# Altium footprint library Integrated Circuits.PcbLib: 40 footprints (part 3 of 3)
Each footprint in its own frame and in the unit in brackets; x right, y up, seen from the top. Pads: shape width x height; smd on the part's side, far side on the other; paste and mask are expansions set on the pad; w line width, h text height; cw(c..) or ccw(c..) is an arc to the next point about the centre after c.
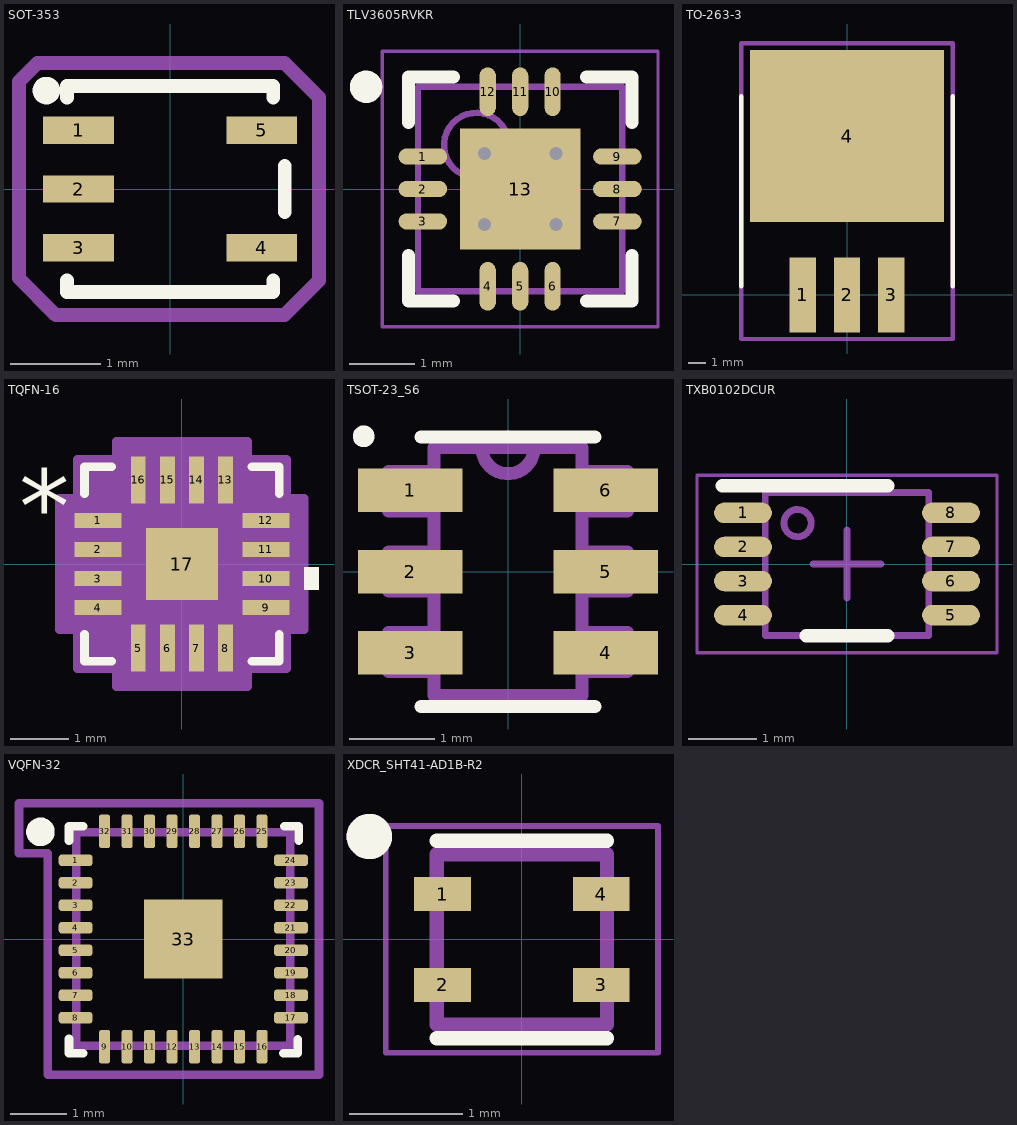
[diagram p2: the footprints below, top view; thin cyan lines are the x and y axes]

## SOT-353 [mil]
pads (5):
  rect 31x12 smd paste+0: 1(-40,25.59) 2(-40,0) 3(-40,-25.59) 4(40,-25.59) 5(40,25.59)
Top Overlay:
  circle w10: c-54,43 r1
  lines w6: -45,-40 -45,-45 45,-45 45,-40 ; -45,40 -45,45 45,45 45,40 ; 50,-10 50,10
Boundary:
  lines w6: -66,-39 -50,-55 45,-55 50,-55 65,-40 65,40 50,55 45,55 -58,55 -66,47 -66,-39
3D body "SC70-5_2P2X1P3_ONS.step": height 43.11, standoff 0, extent -41.5,-39.49 41.5,39.49

## TLV3605RVKR [mm] "QFN, 12-Leads, Body 3.00x3.00mm, Pitch 0.50mm, Thermal Pad 1.86x1.86mm, IPC Medium Density"
height 0.8
pads (13):
  oval 0.75x0.25 smd: 1(-1.5,0.5) 2(-1.5,0) 3(-1.5,-0.5) 7(1.5,-0.5) 8(1.5,0) 9(1.5,0.5)
  oval 0.25x0.75 smd: 4(-0.5,-1.5) 5(0,-1.5) 6(0.5,-1.5) 10(0.5,1.5) 11(0,1.5) 12(-0.5,1.5)
  rect 1.86x1.86 smd: 13(0,0)
via 0.55,-0.55 diameter 0.5 hole 0.2
via -0.55,-0.55 diameter 0.5 hole 0.2
via 0.55,0.55 diameter 0.5 hole 0.2
via -0.55,0.55 diameter 0.5 hole 0.2
Top Overlay:
  circle w0.25: c-2.375,1.575 r0.125
  lines w0.2: -1.725,-1.025 -1.725,-1.725 -1.025,-1.725 ; -1.725,1.025 -1.725,1.725 -1.025,1.725 ; 1.025,-1.725 1.725,-1.725 1.725,-1.025 ; 1.025,1.725 1.725,1.725 1.725,1.025
Mechanical 13:
  circle w0.1: c-0.675,0.675 r0.5
  lines w0.1: -1.575,-1.575 1.575,-1.575 1.575,1.575 -1.575,1.575 -1.575,-1.575
Mechanical 15:
  lines w0.05: -2.125,-2.125 2.125,-2.125 2.125,2.125 -2.125,2.125 -2.125,-2.125
  lines w0.1: -0.5,0 0.5,0 ; 0,-0.5 0,0.5
3D body: height 0.8, standoff 0.05, extent -1.575,-1.575 1.575,1.575

## TO-263-3 [mil]
pads (4):
  rect 60x170 smd: 1(-100,0) 2(0,0) 3(100,0)
  rect 440x390 smd: 4(0,360)
Top Overlay:
  lines w10: -240,20 -240,450 ; 240,20 240,450
Boundary:
  lines w10: -240,-100 240,-100 240,570 -240,570 -240,-100
3D body "User Library-TO263-3.STEP": height 189.26, standoff 0.29, extent -196.85,-71.46 196.85,545.47

## TQFN-16 [mil] "L"
pads (17):
  rect 32x10 smd paste+0 mask+0: 1(-57,29.53) 2(-57,9.84) 3(-57,-9.84) 4(-57,-29.53) 9(57,-29.53) 10(57,-9.84) 11(57,9.84) 12(57,29.53)
  rect 10x32 smd paste+0 mask+0: 5(-29.53,-57) 6(-9.84,-57) 7(9.84,-57) 8(29.53,-57) 13(29.53,57) 14(9.84,57) 15(-9.84,57) 16(-29.53,57)
  rect 49x49 smd paste+0 mask+0: 17(0,0)
Top Overlay:
  region: 83,-2.34 93,-2.34 93,-17.34 83,-17.34
  lines w6: -66,-47.63 -66,-66 -47.63,-66 ; -66,47.63 -66,66 -47.63,66 ; 47.63,-66 66,-66 66,-47.63 ; 47.63,66 66,66 66,47.63
  text "*" at -110.5,14.37 h50
Mechanical 13:
  lines w1: -61,11 -11,61 ; -61,-61 61,-61 61,61 -61,61 -61,-61 ; -61,-35.53 -61,-23.53 -61,-35.53 ; -61,-15.84 -61,-3.84 -61,-15.84 ; -61,3.84 -61,15.84 -61,3.84 ; -61,23.53 -61,35.53 -61,23.53 ; -35.53,-61 -23.53,-61 -35.53,-61 ; -35.53,61 -23.53,61 -35.53,61 ; -15.84,-61 -3.84,-61 -15.84,-61 ; -15.84,61 -3.84,61 -15.84,61 ; 3.84,-61 15.84,-61 3.84,-61 ; 3.84,61 15.84,61 3.84,61 ; 23.53,-61 35.53,-61 23.53,-61 ; 23.53,61 35.53,61 23.53,61 ; 61,-35.53 61,-23.53 61,-35.53 ; 61,-15.84 61,-3.84 61,-15.84 ; 61,3.84 61,15.84 61,3.84 ; 61,23.53 61,35.53 61,23.53
  text "*" at -53.5,14.37 h50
Mechanical 15:
  region: -44.53,-71 -71,-71 -71,-44.53 -83,-44.53 -83,44.53 -71,44.53 -71,71 -44.53,71 -44.53,83 44.53,83 44.53,71 71,71 71,44.53 83,44.53 83,-44.53 71,-44.53 71,-71 44.53,-71 44.53,-83 -44.53,-83
  lines w6: -83,-44.53 -71,-44.53 -71,-71 -44.53,-71 -44.53,-83 44.53,-83 44.53,-71 71,-71 71,-44.53 83,-44.53 83,44.53 71,44.53 71,71 44.53,71 44.53,83 -44.53,83 -44.53,71 -71,71 -71,44.53 -83,44.53 -83,-44.53
3D body "21-0136I_T1633-4_MXM.step": height 32.09, standoff 0, extent -60.98,-60.98 60.98,60.98

## TSOT-23_S6 [mil]
pads (6):
  rect 48x20 smd: 1(-45,37.4) 2(-45,0) 3(-45,-37.4) 4(45,-37.4) 5(45,0) 6(45,37.4)
Top Overlay:
  circle w5: c-66.4,62.24 r2.5
  lines w6: -40,-62 40,-62 ; -40,62 40,62
Mechanical 13:
  lines w6: -12,57 ccw(c0,57) 12,57 ; -12,57 12,57 ; -12,57 -34,57 -34,-57 34,-57 34,57 12,57 ; -55,-46 -55,-28 -34,-28 -34,-46 -55,-46 ; -55,-9 -55,9 -34,9 -34,-9 -55,-9 ; -55,28 -55,46 -34,46 -34,28 -55,28 ; 34,-46 34,-28 55,-28 55,-46 34,-46 ; 34,-9 34,9 55,9 55,-9 34,-9 ; 34,28 34,46 55,46 55,28 34,28
3D body "step_temp.STEP": height 39.37, standoff 0, extent -55.12,-57.09 55.12,57.09

## TXB0102DCUR [mm] "IC TRANSLTR BIDIRECTIONAL 8VSSOP"
pads (8):
  oval 0.85x0.3 smd paste+0 mask+0.051: 1(-1.525,0.75) 2(-1.525,0.25) 3(-1.525,-0.25) 4(-1.525,-0.75) 5(1.525,-0.75) 6(1.525,-0.25) 7(1.525,0.25) 8(1.525,0.75)
Top Overlay:
  lines w0.2: -1.825,1.15 0.6,1.15 ; -0.6,-1.05 0.6,-1.05
Mechanical 13:
  circle w0.1: c-0.725,0.6 r0.2
  lines w0.1: -1.2,-1.05 -1.2,1.05 1.2,1.05 1.2,-1.05 -1.2,-1.05
Mechanical 15:
  lines w0.05: -2.2,-1.3 2.2,-1.3 2.2,1.3 -2.2,1.3 -2.2,-1.3
  lines w0.1: -0.5,0 0.5,0 ; 0,-0.5 0,0.5

## VQFN-32 [mm] "32 pin VQFN package, 4x4mm, 0.4mm pitch"
pads (33):
  rrect50% 0.6x0.2 smd: 1(-1.915,1.4) 2(-1.915,1) 3(-1.915,0.6) 4(-1.915,0.2) 5(-1.915,-0.2) 6(-1.915,-0.6) 7(-1.915,-1) 8(-1.915,-1.4) 17(1.915,-1.4) 18(1.915,-1) 19(1.915,-0.6) 20(1.915,-0.2) 21(1.915,0.2) 22(1.915,0.6) 23(1.915,1) 24(1.915,1.4)
  rrect50% 0.2x0.6 smd: 9(-1.4,-1.915) 10(-1,-1.915) 11(-0.6,-1.915) 12(-0.2,-1.915) 13(0.2,-1.915) 14(0.6,-1.915) 15(1,-1.915) 16(1.4,-1.915) 25(1.4,1.915) 26(1,1.915) 27(0.6,1.915) 28(0.2,1.915) 29(-0.2,1.915) 30(-0.6,1.915) 31(-1,1.915) 32(-1.4,1.915)
  rect 1.4x1.4 smd: 33(0,0)
Top Overlay:
  circle w0.254: c-2.54,1.905 r0.127
  lines w0.152: -2.032,-1.777 -2.032,-2.032 -1.778,-2.032 ; -2.032,1.75 -2.032,2 ; -2.032,2.005 -1.777,2.005 ; 1.777,-2.032 2.032,-2.032 ; 1.8,2.005 2.05,2.005 2.05,1.75 ; 2.032,-2.03 2.032,-1.78
Mechanical 1:
  lines w0.152: -1.9,-1.9 -1.9,1.9 1.9,1.9 1.9,-1.9 -1.9,-1.9
Boundary:
  lines w0.152: -2.921,1.524 -2.413,1.524 -2.413,-2.413 -1.778,-2.413 2.413,-2.413 2.413,2.413 -1.905,2.413 -2.921,2.413 -2.921,1.524
3D body "User Library-VQFN32.STEP": height 0.86, standoff -0.05, extent -2.01,-2.01 2.01,2.01

## XDCR_SHT41-AD1B-R2 [mm] "Sensirion AG SHT14 Sensor Humidity/Temp"
pads (4):
  rect 0.5x0.3 smd: 1(-0.7,0.4) 2(-0.7,-0.4) 3(0.7,-0.4) 4(0.7,0.4)
Top Overlay:
  circle w0.2: c-1.346,0.908 r0.1
  lines w0.127: -0.75,-0.87 0.75,-0.87 ; -0.75,0.87 0.75,0.87
Mechanical 13:
  circle w0.2: c-1.346,0.908 r0.1
  lines w0.127: -0.75,-0.75 -0.75,0.75 0.75,0.75 0.75,-0.75 -0.75,-0.75
Mechanical 15:
  lines w0.05: -1.2,-1 -1.2,1 1.2,1 1.2,-1 -1.2,-1
3D body "step_temp.STEP": height 0.54, standoff 0, extent -0.751,-0.751 0.751,0.751